# Altium footprint library My Library.PcbLib: 872 footprints (part 37 of 55)
Each footprint in its own frame and in the unit in brackets; x right, y up, seen from the top. Pads: shape width x height; smd on the part's side, far side on the other; paste and mask are expansions set on the pad; w line width, h text height; cw(c..) or ccw(c..) is an arc to the next point about the centre after c.
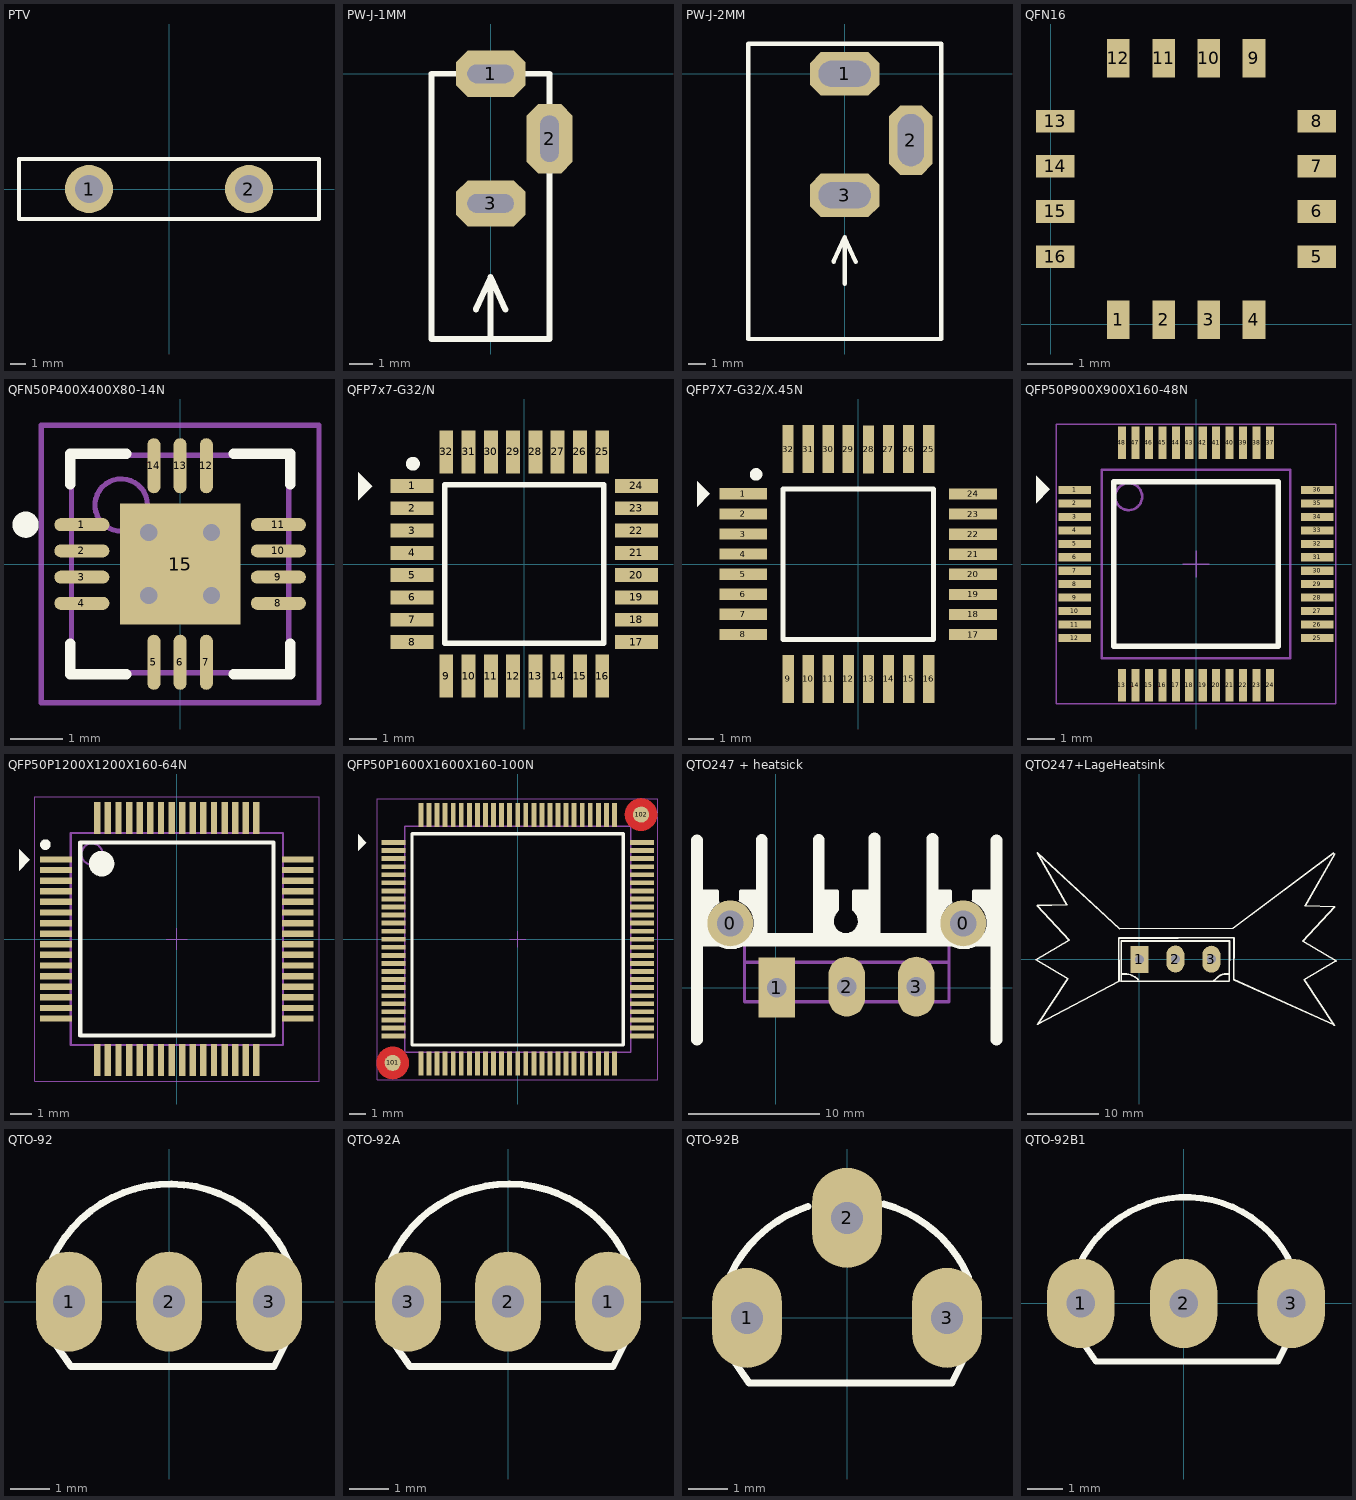
[diagram p36: the footprints below, top view; thin cyan lines are the x and y axes]

## PTV [mil] "MOV protec over votage"
height 1181.1
pads (2):
  round 120 hole 70: 1(-200,0) 2(200,0)
Top Overlay:
  lines w10: -375,-75 -375,75 375,75 375,-75 -375,-75
3D body: height 669.29, standoff -118.11, extent 172.67,-27.5 227.56,27.51
3D body: height 669.29, standoff -118.11, extent -227.33,-27.5 -172.44,27.51
3D body: height 981.15, standoff 196.85, extent -392.85,-79.74 393,77.74

## PW-J-1MM [mm] "Power Header 1mm"
pads (3):
  oct 3x2 hole 0.8 slot 2 at 0 deg paste+1: 1(0,0) 3(0,-5.588)
  oct 2x3 hole 0.8 slot 2 at 90 deg paste+1: 2(2.54,-2.794)
Top Overlay:
  lines w0.254: -0.635,-10.16 0,-8.763 ; 0,-11.43 0,-8.763 ; 0.635,-10.16 0,-8.763 ; -2.54,-11.43 2.54,-11.43 2.54,0 -2.54,0 -2.54,-11.43

## PW-J-2MM [mm] "Power Header 2mm"
pads (3):
  oct 4x2.5 hole 1.5 slot 3 at 0 deg paste+1: 1(0,0) 3(0,-6.985)
  oct 2.5x4 hole 1.5 slot 3 at 90 deg paste+1: 2(3.81,-3.81)
Top Overlay:
  lines w0.254: -0.635,-10.795 0,-9.398 ; 0,-12.065 0,-9.398 ; 0.635,-10.795 0,-9.398 ; -5.537,-15.24 -5.537,1.727 5.563,1.727 5.563,-15.24 -5.537,-15.24
3D body "User Library-PowerJack-2_5x5_7mm.step": height 11, standoff -3.5, extent -5.564,-15.2 3.836,0

## QFN16 [mm] "QFN 16 LEAD 6x6mm"
height 2
pads (16):
  rect 0.5x0.85 smd: 1(1.5,0.104) 2(2.5,0.104) 3(3.5,0.104) 4(4.5,0.104) 9(4.5,5.89) 10(3.5,5.89) 11(2.5,5.89) 12(1.5,5.89)
  rect 0.85x0.5 smd: 5(5.89,1.5) 6(5.89,2.5) 7(5.89,3.5) 8(5.89,4.5) 13(0.1,4.5) 14(0.1,3.5) 15(0.1,2.5) 16(0.1,1.5)
3D body: height 0.8, standoff 0, extent 0,0 6,6

## QFN50P400X400X80-14N [mm] "QFN, 14-Leads, Body 4,2x4,2mm (max), Pitch 0,50mm, IPC Medium Density"
height 0.8
pads (15):
  oval 1.05x0.25 smd: 1(-1.875,0.75) 2(-1.875,0.25) 3(-1.875,-0.25) 4(-1.875,-0.75) 8(1.875,-0.75) 9(1.875,-0.25) 10(1.875,0.25) 11(1.875,0.75)
  oval 0.25x1.05 smd: 5(-0.5,-1.875) 6(0,-1.875) 7(0.5,-1.875) 12(0.5,1.875) 13(0,1.875) 14(-0.5,1.875)
  rect 2.3x2.3 smd: 15(0,0)
via -0.6,0.6 diameter 0.66 hole 0.33
via 0.6,0.6 diameter 0.66 hole 0.33
via -0.6,-0.6 diameter 0.66 hole 0.33
via 0.6,-0.6 diameter 0.66 hole 0.33
Top Overlay:
  circle w0.25: c-2.95,0.75 r0.125
  lines w0.2: -2.1,-1.525 -2.1,-2.1 -1.025,-2.1 ; -2.1,1.525 -2.1,2.1 -1.025,2.1 ; 1.025,-2.1 2.1,-2.1 2.1,-1.525 ; 1.025,2.1 2.1,2.1 2.1,1.525
Mechanical 13:
  circle w0.1: c-1.125,1.125 r0.5
  lines w0.1: -2.075,-2.075 -2.075,2.075 2.075,2.075 2.075,-2.075 -2.075,-2.075
Mechanical 15:
  lines w0.1: -0.5,0 0.5,0 ; 0,-0.5 0,0.5 ; -2.65,-2.65 -2.65,2.65 2.65,2.65 2.65,-2.65 -2.65,-2.65
3D body: height 0.8, standoff 0.01, extent -2.075,-2.075 2.075,2.075

## QFP7x7-G32/N [mm] "32-Pin Plastic Thin Quad Flat Pack (TFQP)"
height 1.2
pads (32):
  rect 1.55x0.5 smd: 1(-4.025,2.8) 2(-4.025,2) 3(-4.025,1.2) 4(-4.025,0.4) 5(-4.025,-0.4) 6(-4.025,-1.2) 7(-4.025,-2) 8(-4.025,-2.8) 17(4.025,-2.8) 18(4.025,-2) 19(4.025,-1.2) 20(4.025,-0.4) 21(4.025,0.4) 22(4.025,1.2) 23(4.025,2) 24(4.025,2.8)
  rect 0.5x1.55 smd: 9(-2.8,-4.025) 10(-2,-4.025) 11(-1.2,-4.025) 12(-0.4,-4.025) 13(0.4,-4.025) 14(1.2,-4.025) 15(2,-4.025) 16(2.8,-4.025) 25(2.8,4.025) 26(2,4.025) 27(1.2,4.025) 28(0.4,4.025) 29(-0.4,4.025) 30(-1.2,4.025) 31(-2,4.025) 32(-2.8,4.025)
Top Overlay:
  circle w0.25: c-4,3.6 r0.125
  region: -5.969,3.302 -5.461,2.794 -5.969,2.286
  lines w0.2: -2.85,-2.85 2.85,-2.85 2.85,2.85 -2.85,2.85 -2.85,-2.85

## QFP7X7-G32/X.45N [mm] "QFP; 32 Leads; Body 7 x 7 mm; Pitch 0.8 mm"
height 1.6
pads (32):
  rect 1.905x0.45 smd: 1(-4.583,2.8) 2(-4.583,2) 3(-4.583,1.2) 4(-4.583,0.4) 5(-4.583,-0.4) 6(-4.583,-1.2) 7(-4.583,-2) 8(-4.583,-2.8) 17(4.572,-2.806) 18(4.572,-2.006) 19(4.572,-1.206) 20(4.572,-0.406) 21(4.572,0.394) 22(4.572,1.194) 23(4.572,1.994) 24(4.572,2.794)
  rect 0.45x1.905 smd: 9(-2.794,-4.572) 10(-1.994,-4.572) 11(-1.194,-4.572) 12(-0.394,-4.572) 13(0.406,-4.572) 14(1.206,-4.572) 15(2.006,-4.572) 16(2.806,-4.572) 25(2.8,4.583) 26(2,4.583) 27(1.2,4.583) 28(0.406,4.572) 29(-0.4,4.583) 30(-1.2,4.583) 31(-2,4.583) 32(-2.8,4.583)
Top Overlay:
  circle w0.25: c-4.075,3.575 r0.125
  region: -6.426,3.302 -5.918,2.794 -6.426,2.286
  lines w0.2: -3,-3 -3,3 3,3 3,-3 -3,-3
3D body "Atmega8.step": height 1.13, standoff 0.02, extent -4.743,-4.857 4.857,4.743

## QFP50P900X900X160-48N [mm] "QFP,0.50mm pitch,square;12 pin X 12 pin,7.00mm X 7.00mm X 1.60mm H body"
height 1.6
pads (48):
  rect 1.2x0.3 smd: 1(-4.5,2.75) 2(-4.5,2.25) 3(-4.5,1.75) 4(-4.5,1.25) 5(-4.5,0.75) 6(-4.5,0.25) 7(-4.5,-0.25) 8(-4.5,-0.75) 9(-4.5,-1.25) 10(-4.5,-1.75) 11(-4.5,-2.25) 12(-4.5,-2.75) 25(4.5,-2.75) 26(4.5,-2.25) 27(4.5,-1.75) 28(4.5,-1.25) 29(4.5,-0.75) 30(4.5,-0.25) 31(4.5,0.25) 32(4.5,0.75) 33(4.5,1.25) 34(4.5,1.75) 35(4.5,2.25) 36(4.5,2.75)
  rect 0.3x1.2 smd: 13(-2.75,-4.5) 14(-2.25,-4.5) 15(-1.75,-4.5) 16(-1.25,-4.5) 17(-0.75,-4.5) 18(-0.25,-4.5) 19(0.25,-4.5) 20(0.75,-4.5) 21(1.25,-4.5) 22(1.75,-4.5) 23(2.25,-4.5) 24(2.75,-4.5) 37(2.75,4.5) 38(2.25,4.5) 39(1.75,4.5) 40(1.25,4.5) 41(0.75,4.5) 42(0.25,4.5) 43(-0.25,4.5) 44(-0.75,4.5) 45(-1.25,4.5) 46(-1.75,4.5) 47(-2.25,4.5) 48(-2.75,4.5)
Top Overlay:
  region: -5.944,3.277 -5.436,2.769 -5.944,2.261
  lines w0.2: -3.05,-3.05 3.05,-3.05 3.05,3.05 -3.05,3.05 -3.05,-3.05
Mechanical 12:
  lines w0.001: -3.5,-3.5 3.5,-3.5 3.5,3.5 -3.5,3.5 -3.5,-3.5
Mechanical 13:
  circle w0.1: c-2.5,2.5 r0.5
  lines w0.1: -3.5,-3.5 3.5,-3.5 3.5,3.5 -3.5,3.5 -3.5,-3.5
Mechanical 15:
  lines w0.05: -0.5,0 0.5,0 ; 0,-0.5 0,0.5 ; -5.2,-5.2 5.2,-5.2 5.2,5.2 -5.2,5.2 -5.2,-5.2
3D body "SW3dPS-P-LQFP48-7x7-0.50.STEP": height 1.42, standoff -0.03, extent -4.496,-4.496 4.504,4.504

## QFP50P1200X1200X160-64N [mm] "QFP,0.50mm pitch,square;16 pin X 16 pin,10.00mm X 10.00mm X 1.60mm H body"
height 1.6
pads (64):
  rect 1.5x0.3 smd: 1(-5.7,3.75) 2(-5.7,3.25) 3(-5.7,2.75) 4(-5.7,2.25) 5(-5.7,1.75) 6(-5.7,1.25) 7(-5.7,0.75) 8(-5.7,0.25) 9(-5.7,-0.25) 10(-5.7,-0.75) 11(-5.7,-1.25) 12(-5.7,-1.75) 13(-5.7,-2.25) 14(-5.7,-2.75) 15(-5.7,-3.25) 16(-5.7,-3.75) 33(5.7,-3.75) 34(5.7,-3.25) 35(5.7,-2.75) 36(5.7,-2.25) 37(5.7,-1.75) 38(5.7,-1.25) 39(5.7,-0.75) 40(5.7,-0.25) 41(5.7,0.25) 42(5.7,0.75) 43(5.7,1.25) 44(5.7,1.75) 45(5.7,2.25) 46(5.7,2.75) 47(5.7,3.25) 48(5.7,3.75)
  rect 0.3x1.5 smd: 17(-3.75,-5.7) 18(-3.25,-5.7) 19(-2.75,-5.7) 20(-2.25,-5.7) 21(-1.75,-5.7) 22(-1.25,-5.7) 23(-0.75,-5.7) 24(-0.25,-5.7) 25(0.25,-5.7) 26(0.75,-5.7) 27(1.25,-5.7) 28(1.75,-5.7) 29(2.25,-5.7) 30(2.75,-5.7) 31(3.25,-5.7) 32(3.75,-5.7) 49(3.75,5.7) 50(3.25,5.7) 51(2.75,5.7) 52(2.25,5.7) 53(1.75,5.7) 54(1.25,5.7) 55(0.75,5.7) 56(0.25,5.7) 57(-0.25,5.7) 58(-0.75,5.7) 59(-1.25,5.7) 60(-1.75,5.7) 61(-2.25,5.7) 62(-2.75,5.7) 63(-3.25,5.7) 64(-3.75,5.7)
Top Overlay:
  circle w0.25: c-6.2,4.45 r0.125
  circle w0.6: c-3.55,3.55 r0.3
  region: -7.442,4.242 -6.934,3.734 -7.442,3.226
  lines w0.2: -4.55,-4.55 -4.55,4.55 4.55,4.55 4.55,-4.55 -4.55,-4.55
Mechanical 12:
  lines w0.001: -5,-5 -5,5 5,5 5,-5 -5,-5
Mechanical 13:
  circle w0.1: c-4,4 r0.5
  lines w0.1: -5,-5 -5,5 5,5 5,-5 -5,-5
Mechanical 15:
  lines w0.05: -0.5,0 0.5,0 ; 0,-0.5 0,0.5 ; -6.7,-6.7 -6.7,6.7 6.7,6.7 6.7,-6.7 -6.7,-6.7

## QFP50P1600X1600X160-100N [mm] "QFP,0.50mm pitch,square;25 pin X 25 pin,14.00mm X 14.00mm X 1.60mm H body"
height 1.6
pads (102):
  rect 1.5x0.3 smd: 1(-7.7,6) 2(-7.7,5.5) 3(-7.7,5) 4(-7.7,4.5) 5(-7.7,4) 6(-7.7,3.5) 7(-7.7,3) 8(-7.7,2.5) 9(-7.7,2) 10(-7.7,1.5) 11(-7.7,1) 12(-7.7,0.5) 13(-7.7,0) 14(-7.7,-0.5) 15(-7.7,-1) 16(-7.7,-1.5) 17(-7.7,-2) 18(-7.7,-2.5) 19(-7.7,-3) 20(-7.7,-3.5) 21(-7.7,-4) 22(-7.7,-4.5) 23(-7.7,-5) 24(-7.7,-5.5) 25(-7.7,-6) 51(7.7,-6) 52(7.7,-5.5) 53(7.7,-5) 54(7.7,-4.5) 55(7.7,-4) 56(7.7,-3.5) 57(7.7,-3) 58(7.7,-2.5) 59(7.7,-2) 60(7.7,-1.5) 61(7.7,-1) 62(7.7,-0.5) 63(7.7,0) 64(7.7,0.5) 65(7.7,1) 66(7.7,1.5) 67(7.7,2) 68(7.7,2.5) 69(7.7,3) 70(7.7,3.5) 71(7.7,4) 72(7.7,4.5) 73(7.7,5) 74(7.7,5.5) 75(7.7,6)
  rect 0.3x1.5 smd: 26(-6,-7.7) 27(-5.5,-7.7) 28(-5,-7.7) 29(-4.5,-7.7) 30(-4,-7.7) 31(-3.5,-7.7) 32(-3,-7.7) 33(-2.5,-7.7) 34(-2,-7.7) 35(-1.5,-7.7) 36(-1,-7.7) 37(-0.5,-7.7) 38(0,-7.7) 39(0.5,-7.7) 40(1,-7.7) 41(1.5,-7.7) 42(2,-7.7) 43(2.5,-7.7) 44(3,-7.7) 45(3.5,-7.7) 46(4,-7.7) 47(4.5,-7.7) 48(5,-7.7) 49(5.5,-7.7) 50(6,-7.7) 76(6,7.7) 77(5.5,7.7) 78(5,7.7) 79(4.5,7.7) 80(4,7.7) 81(3.5,7.7) 82(3,7.7) 83(2.5,7.7) 84(2,7.7) 85(1.5,7.7) 86(1,7.7) 87(0.5,7.7) 88(0,7.7) 89(-0.5,7.7) 90(-1,7.7) 91(-1.5,7.7) 92(-2,7.7) 93(-2.5,7.7) 94(-3,7.7) 95(-3.5,7.7) 96(-4,7.7) 97(-4.5,7.7) 98(-5,7.7) 99(-5.5,7.7) 100(-6,7.7)
  round 1 smd: 101(-7.753,-7.669) 102(7.647,7.731)
Top Layer:
  pour cut-out: 153 vertices and 0 holes, not listed, extent -8.753,-8.669 -6.753,-6.669
  pour cut-out: 153 vertices and 0 holes, not listed, extent 6.647,6.731 8.647,8.731
Top Overlay:
  region: -9.906,6.508 -9.398,6 -9.906,5.492
  lines w0.2: -6.55,-6.55 -6.55,6.55 6.55,6.55 6.55,-6.55 -6.55,-6.55
Mechanical 12:
  lines w0.001: -7,-7 -7,7 7,7 7,-7 -7,-7
Mechanical 13:
  lines w0.1: -7,-7 -7,7 ; -7,-7 7,-7 ; -7,-7 -7,7 ; -7,-7 7,-7 ; -7,7 7,7 ; -7,7 7,7 ; 7,-7 7,7 ; 7,-7 7,7
Mechanical 15:
  lines w0.05: -0.5,0 0.5,0 ; 0,-0.5 0,0.5 ; -8.7,-8.7 -8.7,8.7 8.7,8.7 8.7,-8.7 -8.7,-8.7
3D body: height 1.6, standoff 0.05, extent -7,-7 7,7
3D body: height 0.85, standoff 0.75, extent -7.264,5.85 -6.807,6.147
3D body: height 0.85, standoff 0, extent -7.351,5.85 -7.264,6.147
3D body: height 0.1, standoff 0, extent -8.085,5.85 -7.351,6.147
3D body: height 0.1, standoff 0, extent -8.085,5.35 -7.351,5.647
3D body: height 0.85, standoff 0, extent -7.351,5.35 -7.264,5.647
3D body: height 0.85, standoff 0.75, extent -7.264,5.35 -6.807,5.647
3D body: height 0.1, standoff 0, extent -8.085,4.85 -7.351,5.147
3D body: height 0.85, standoff 0, extent -7.351,4.85 -7.264,5.147
3D body: height 0.85, standoff 0.75, extent -7.264,4.85 -6.807,5.147
3D body: height 0.85, standoff 0.75, extent -7.264,3.35 -6.807,3.647
3D body: height 0.85, standoff 0, extent -7.351,3.35 -7.264,3.647
3D body: height 0.1, standoff 0, extent -8.085,3.35 -7.351,3.647
3D body: height 0.85, standoff 0.75, extent -7.264,3.85 -6.807,4.147
3D body: height 0.85, standoff 0, extent -7.351,3.85 -7.264,4.147
3D body: height 0.1, standoff 0, extent -8.085,3.85 -7.351,4.147
3D body: height 0.1, standoff 0, extent -8.085,4.35 -7.351,4.647
3D body: height 0.85, standoff 0, extent -7.351,4.35 -7.264,4.647
3D body: height 0.85, standoff 0.75, extent -7.264,4.35 -6.807,4.647
3D body: height 0.85, standoff 0.75, extent -7.264,1.85 -6.807,2.147
3D body: height 0.85, standoff 0, extent -7.351,1.85 -7.264,2.147
3D body: height 0.1, standoff 0, extent -8.085,1.85 -7.351,2.147
3D body: height 0.1, standoff 0, extent -8.085,1.35 -7.351,1.647
3D body: height 0.85, standoff 0, extent -7.351,1.35 -7.264,1.647
3D body: height 0.85, standoff 0.75, extent -7.264,1.35 -6.807,1.647
3D body: height 0.85, standoff 0.75, extent -7.264,2.35 -6.807,2.647
3D body: height 0.85, standoff 0, extent -7.351,2.35 -7.264,2.647
3D body: height 0.1, standoff 0, extent -8.085,2.35 -7.351,2.647
3D body: height 0.85, standoff 0.75, extent -7.264,2.85 -6.807,3.147
3D body: height 0.85, standoff 0, extent -7.351,2.85 -7.264,3.147
3D body: height 0.1, standoff 0, extent -8.085,2.85 -7.351,3.147
3D body: height 0.1, standoff 0, extent -8.085,3.35 -7.351,3.647
3D body: height 0.85, standoff 0, extent -7.351,3.35 -7.264,3.647
3D body: height 0.85, standoff 0.75, extent -7.264,3.35 -6.807,3.647
3D body: height 0.85, standoff 0.75, extent -7.264,-0.65 -6.807,-0.353
3D body: height 0.85, standoff 0, extent -7.351,-0.65 -7.264,-0.353
3D body: height 0.1, standoff 0, extent -8.085,-0.65 -7.351,-0.353
3D body: height 0.1, standoff 0, extent -8.085,-1.15 -7.351,-0.853
3D body: height 0.85, standoff 0, extent -7.351,-1.15 -7.264,-0.853
3D body: height 0.85, standoff 0.75, extent -7.264,-1.15 -6.807,-0.853
3D body: height 0.85, standoff 0.75, extent -7.264,-0.15 -6.807,0.147
3D body: height 0.85, standoff 0, extent -7.351,-0.15 -7.264,0.147
3D body: height 0.1, standoff 0, extent -8.085,-0.15 -7.351,0.147
3D body: height 0.85, standoff 0.75, extent -7.264,0.35 -6.807,0.647
3D body: height 0.85, standoff 0, extent -7.351,0.35 -7.264,0.647
3D body: height 0.1, standoff 0, extent -8.085,0.35 -7.351,0.647
3D body: height 0.1, standoff 0, extent -8.085,0.85 -7.351,1.147
3D body: height 0.85, standoff 0, extent -7.351,0.85 -7.264,1.147
3D body: height 0.85, standoff 0.75, extent -7.264,0.85 -6.807,1.147
3D body: height 0.85, standoff 0.75, extent -7.264,-3.15 -6.807,-2.853
3D body: height 0.85, standoff 0, extent -7.351,-3.15 -7.264,-2.853
3D body: height 0.1, standoff 0, extent -8.085,-3.15 -7.351,-2.853
3D body: height 0.1, standoff 0, extent -8.085,-3.65 -7.351,-3.353
3D body: height 0.85, standoff 0, extent -7.351,-3.65 -7.264,-3.353
3D body: height 0.85, standoff 0.75, extent -7.264,-3.65 -6.807,-3.353
3D body: height 0.85, standoff 0.75, extent -7.264,-2.65 -6.807,-2.353
3D body: height 0.85, standoff 0, extent -7.351,-2.65 -7.264,-2.353
3D body: height 0.1, standoff 0, extent -8.085,-2.65 -7.351,-2.353
3D body: height 0.85, standoff 0.75, extent -7.264,-2.15 -6.807,-1.853
3D body: height 0.85, standoff 0, extent -7.351,-2.15 -7.264,-1.853
3D body: height 0.1, standoff 0, extent -8.085,-2.15 -7.351,-1.853
3D body: height 0.1, standoff 0, extent -8.085,-1.65 -7.351,-1.353
3D body: height 0.85, standoff 0, extent -7.351,-1.65 -7.264,-1.353
3D body: height 0.85, standoff 0.75, extent -7.264,-1.65 -6.807,-1.353
3D body: height 0.85, standoff 0.75, extent -7.264,-5.65 -6.807,-5.353
3D body: height 0.85, standoff 0, extent -7.351,-5.65 -7.264,-5.353
3D body: height 0.1, standoff 0, extent -8.085,-5.65 -7.351,-5.353
3D body: height 0.1, standoff 0, extent -8.085,-6.15 -7.351,-5.853
3D body: height 0.85, standoff 0, extent -7.351,-6.15 -7.264,-5.853
3D body: height 0.85, standoff 0.75, extent -7.264,-6.15 -6.807,-5.853
3D body: height 0.85, standoff 0.75, extent -7.264,-5.15 -6.807,-4.853
3D body: height 0.85, standoff 0, extent -7.351,-5.15 -7.264,-4.853
3D body: height 0.1, standoff 0, extent -8.085,-5.15 -7.351,-4.853
3D body: height 0.85, standoff 0.75, extent -7.264,-4.65 -6.807,-4.353
3D body: height 0.85, standoff 0, extent -7.351,-4.65 -7.264,-4.353
3D body: height 0.1, standoff 0, extent -8.085,-4.65 -7.351,-4.353
3D body: height 0.1, standoff 0, extent -8.085,-4.15 -7.351,-3.853
3D body: height 0.85, standoff 0, extent -7.351,-4.15 -7.264,-3.853
3D body: height 0.85, standoff 0.75, extent -7.264,-4.15 -6.807,-3.853
3D body: height 0.85, standoff 0.75, extent 3.853,-7.264 4.15,-6.807
3D body: height 0.85, standoff 0, extent 3.853,-7.351 4.15,-7.264
3D body: height 0.1, standoff 0, extent 3.853,-8.085 4.15,-7.351
3D body: height 0.1, standoff 0, extent 4.353,-8.085 4.65,-7.351
3D body: height 0.85, standoff 0, extent 4.353,-7.351 4.65,-7.264
3D body: height 0.85, standoff 0.75, extent 4.353,-7.264 4.65,-6.807
3D body: height 0.1, standoff 0, extent 4.853,-8.085 5.15,-7.351
3D body: height 0.85, standoff 0, extent 4.853,-7.351 5.15,-7.264
3D body: height 0.85, standoff 0.75, extent 4.853,-7.264 5.15,-6.807
3D body: height 0.85, standoff 0.75, extent 5.853,-7.264 6.15,-6.807
3D body: height 0.85, standoff 0, extent 5.853,-7.351 6.15,-7.264
3D body: height 0.1, standoff 0, extent 5.853,-8.085 6.15,-7.351
3D body: height 0.1, standoff 0, extent 5.353,-8.085 5.65,-7.351
3D body: height 0.85, standoff 0, extent 5.353,-7.351 5.65,-7.264
3D body: height 0.85, standoff 0.75, extent 5.353,-7.264 5.65,-6.807
3D body: height 0.85, standoff 0.75, extent 1.353,-7.264 1.65,-6.807
3D body: height 0.85, standoff 0, extent 1.353,-7.351 1.65,-7.264
3D body: height 0.1, standoff 0, extent 1.353,-8.085 1.65,-7.351
3D body: height 0.1, standoff 0, extent 1.853,-8.085 2.15,-7.351
3D body: height 0.85, standoff 0, extent 1.853,-7.351 2.15,-7.264
3D body: height 0.85, standoff 0.75, extent 1.853,-7.264 2.15,-6.807
3D body: height 0.1, standoff 0, extent 2.353,-8.085 2.65,-7.351
3D body: height 0.85, standoff 0, extent 2.353,-7.351 2.65,-7.264
3D body: height 0.85, standoff 0.75, extent 2.353,-7.264 2.65,-6.807
3D body: height 0.85, standoff 0.75, extent 3.353,-7.264 3.65,-6.807
3D body: height 0.85, standoff 0, extent 3.353,-7.351 3.65,-7.264
3D body: height 0.1, standoff 0, extent 3.353,-8.085 3.65,-7.351
3D body: height 0.1, standoff 0, extent 2.853,-8.085 3.15,-7.351
3D body: height 0.85, standoff 0, extent 2.853,-7.351 3.15,-7.264
3D body: height 0.85, standoff 0.75, extent 2.853,-7.264 3.15,-6.807
3D body: height 0.85, standoff 0.75, extent -1.147,-7.264 -0.85,-6.807
3D body: height 0.85, standoff 0, extent -1.147,-7.351 -0.85,-7.264
3D body: height 0.1, standoff 0, extent -1.147,-8.085 -0.85,-7.351
3D body: height 0.1, standoff 0, extent -0.647,-8.085 -0.35,-7.351
3D body: height 0.85, standoff 0, extent -0.647,-7.351 -0.35,-7.264
3D body: height 0.85, standoff 0.75, extent -0.647,-7.264 -0.35,-6.807
3D body: height 0.1, standoff 0, extent -0.147,-8.085 0.15,-7.351
3D body: height 0.85, standoff 0, extent -0.147,-7.351 0.15,-7.264
3D body: height 0.85, standoff 0.75, extent -0.147,-7.264 0.15,-6.807
3D body: height 0.85, standoff 0.75, extent 0.853,-7.264 1.15,-6.807
3D body: height 0.85, standoff 0, extent 0.853,-7.351 1.15,-7.264
3D body: height 0.1, standoff 0, extent 0.853,-8.085 1.15,-7.351
3D body: height 0.1, standoff 0, extent 0.353,-8.085 0.65,-7.351
3D body: height 0.85, standoff 0, extent 0.353,-7.351 0.65,-7.264
3D body: height 0.85, standoff 0.75, extent 0.353,-7.264 0.65,-6.807
3D body: height 0.85, standoff 0.75, extent -3.647,-7.264 -3.35,-6.807
3D body: height 0.85, standoff 0, extent -3.647,-7.351 -3.35,-7.264
3D body: height 0.1, standoff 0, extent -3.647,-8.085 -3.35,-7.351
3D body: height 0.1, standoff 0, extent -3.147,-8.085 -2.85,-7.351
3D body: height 0.85, standoff 0, extent -3.147,-7.351 -2.85,-7.264
3D body: height 0.85, standoff 0.75, extent -3.147,-7.264 -2.85,-6.807
3D body: height 0.1, standoff 0, extent -2.647,-8.085 -2.35,-7.351
3D body: height 0.85, standoff 0, extent -2.647,-7.351 -2.35,-7.264
3D body: height 0.85, standoff 0.75, extent -2.647,-7.264 -2.35,-6.807
3D body: height 0.85, standoff 0.75, extent -1.647,-7.264 -1.35,-6.807
3D body: height 0.85, standoff 0, extent -1.647,-7.351 -1.35,-7.264
3D body: height 0.1, standoff 0, extent -1.647,-8.085 -1.35,-7.351
3D body: height 0.1, standoff 0, extent -2.147,-8.085 -1.85,-7.351
3D body: height 0.85, standoff 0, extent -2.147,-7.351 -1.85,-7.264
3D body: height 0.85, standoff 0.75, extent -2.147,-7.264 -1.85,-6.807
3D body: height 0.85, standoff 0.75, extent -4.647,-7.264 -4.35,-6.807
3D body: height 0.85, standoff 0, extent -4.647,-7.351 -4.35,-7.264
3D body: height 0.1, standoff 0, extent -4.647,-8.085 -4.35,-7.351
3D body: height 0.1, standoff 0, extent -4.147,-8.085 -3.85,-7.351
3D body: height 0.85, standoff 0, extent -4.147,-7.351 -3.85,-7.264
3D body: height 0.85, standoff 0.75, extent -4.147,-7.264 -3.85,-6.807
3D body: height 0.1, standoff 0, extent -3.647,-8.085 -3.35,-7.351
3D body: height 0.85, standoff 0, extent -3.647,-7.351 -3.35,-7.264
3D body: height 0.85, standoff 0.75, extent -3.647,-7.264 -3.35,-6.807
3D body: height 0.85, standoff 0.75, extent -5.147,-7.264 -4.85,-6.807
3D body: height 0.85, standoff 0, extent -5.147,-7.351 -4.85,-7.264
3D body: height 0.1, standoff 0, extent -5.147,-8.085 -4.85,-7.351
3D body: height 0.85, standoff 0.75, extent -5.647,-7.264 -5.35,-6.807
3D body: height 0.85, standoff 0, extent -5.647,-7.351 -5.35,-7.264
3D body: height 0.1, standoff 0, extent -5.647,-8.085 -5.35,-7.351
3D body: height 0.1, standoff 0, extent -6.147,-8.085 -5.85,-7.351
3D body: height 0.85, standoff 0, extent -6.147,-7.351 -5.85,-7.264
3D body: height 0.85, standoff 0.75, extent -6.147,-7.264 -5.85,-6.807
3D body: height 0.85, standoff 0.75, extent 6.807,3.853 7.264,4.15
3D body: height 0.85, standoff 0, extent 7.264,3.853 7.351,4.15
3D body: height 0.1, standoff 0, extent 7.351,3.853 8.085,4.15
3D body: height 0.1, standoff 0, extent 7.351,4.353 8.085,4.65
3D body: height 0.85, standoff 0, extent 7.264,4.353 7.351,4.65
3D body: height 0.85, standoff 0.75, extent 6.807,4.353 7.264,4.65
3D body: height 0.1, standoff 0, extent 7.351,4.853 8.085,5.15
3D body: height 0.85, standoff 0, extent 7.264,4.853 7.351,5.15
3D body: height 0.85, standoff 0.75, extent 6.807,4.853 7.264,5.15
3D body: height 0.85, standoff 0.75, extent 6.807,5.853 7.264,6.15
3D body: height 0.85, standoff 0, extent 7.264,5.853 7.351,6.15
3D body: height 0.1, standoff 0, extent 7.351,5.853 8.085,6.15
3D body: height 0.1, standoff 0, extent 7.351,5.353 8.085,5.65
3D body: height 0.85, standoff 0, extent 7.264,5.353 7.351,5.65
3D body: height 0.85, standoff 0.75, extent 6.807,5.353 7.264,5.65
3D body: height 0.85, standoff 0.75, extent 6.807,1.353 7.264,1.65
3D body: height 0.85, standoff 0, extent 7.264,1.353 7.351,1.65
3D body: height 0.1, standoff 0, extent 7.351,1.353 8.085,1.65
3D body: height 0.1, standoff 0, extent 7.351,1.853 8.085,2.15
3D body: height 0.85, standoff 0, extent 7.264,1.853 7.351,2.15
3D body: height 0.85, standoff 0.75, extent 6.807,1.853 7.264,2.15
3D body: height 0.1, standoff 0, extent 7.351,2.353 8.085,2.65
3D body: height 0.85, standoff 0, extent 7.264,2.353 7.351,2.65
3D body: height 0.85, standoff 0.75, extent 6.807,2.353 7.264,2.65
3D body: height 0.85, standoff 0.75, extent 6.807,3.353 7.264,3.65
3D body: height 0.85, standoff 0, extent 7.264,3.353 7.351,3.65
3D body: height 0.1, standoff 0, extent 7.351,3.353 8.085,3.65
3D body: height 0.1, standoff 0, extent 7.351,2.853 8.085,3.15
3D body: height 0.85, standoff 0, extent 7.264,2.853 7.351,3.15
3D body: height 0.85, standoff 0.75, extent 6.807,2.853 7.264,3.15
3D body: height 0.85, standoff 0.75, extent 6.807,-1.147 7.264,-0.85
3D body: height 0.85, standoff 0, extent 7.264,-1.147 7.351,-0.85
3D body: height 0.1, standoff 0, extent 7.351,-1.147 8.085,-0.85
3D body: height 0.1, standoff 0, extent 7.351,-0.647 8.085,-0.35
3D body: height 0.85, standoff 0, extent 7.264,-0.647 7.351,-0.35
3D body: height 0.85, standoff 0.75, extent 6.807,-0.647 7.264,-0.35
3D body: height 0.1, standoff 0, extent 7.351,-0.147 8.085,0.15
3D body: height 0.85, standoff 0, extent 7.264,-0.147 7.351,0.15
3D body: height 0.85, standoff 0.75, extent 6.807,-0.147 7.264,0.15
3D body: height 0.85, standoff 0.75, extent 6.807,0.853 7.264,1.15
3D body: height 0.85, standoff 0, extent 7.264,0.853 7.351,1.15
3D body: height 0.1, standoff 0, extent 7.351,0.853 8.085,1.15
3D body: height 0.1, standoff 0, extent 7.351,0.353 8.085,0.65
3D body: height 0.85, standoff 0, extent 7.264,0.353 7.351,0.65
3D body: height 0.85, standoff 0.75, extent 6.807,0.353 7.264,0.65
3D body: height 0.85, standoff 0.75, extent 6.807,-3.647 7.264,-3.35
3D body: height 0.85, standoff 0, extent 7.264,-3.647 7.351,-3.35
3D body: height 0.1, standoff 0, extent 7.351,-3.647 8.085,-3.35
3D body: height 0.1, standoff 0, extent 7.351,-3.147 8.085,-2.85
3D body: height 0.85, standoff 0, extent 7.264,-3.147 7.351,-2.85
3D body: height 0.85, standoff 0.75, extent 6.807,-3.147 7.264,-2.85
3D body: height 0.1, standoff 0, extent 7.351,-2.647 8.085,-2.35
3D body: height 0.85, standoff 0, extent 7.264,-2.647 7.351,-2.35
3D body: height 0.85, standoff 0.75, extent 6.807,-2.647 7.264,-2.35
3D body: height 0.85, standoff 0.75, extent 6.807,-1.647 7.264,-1.35
3D body: height 0.85, standoff 0, extent 7.264,-1.647 7.351,-1.35
3D body: height 0.1, standoff 0, extent 7.351,-1.647 8.085,-1.35
3D body: height 0.1, standoff 0, extent 7.351,-2.147 8.085,-1.85
3D body: height 0.85, standoff 0, extent 7.264,-2.147 7.351,-1.85
3D body: height 0.85, standoff 0.75, extent 6.807,-2.147 7.264,-1.85
3D body: height 0.85, standoff 0.75, extent 6.807,-4.647 7.264,-4.35
3D body: height 0.85, standoff 0, extent 7.264,-4.647 7.351,-4.35
3D body: height 0.1, standoff 0, extent 7.351,-4.647 8.085,-4.35
3D body: height 0.1, standoff 0, extent 7.351,-4.147 8.085,-3.85
3D body: height 0.85, standoff 0, extent 7.264,-4.147 7.351,-3.85
3D body: height 0.85, standoff 0.75, extent 6.807,-4.147 7.264,-3.85
3D body: height 0.1, standoff 0, extent 7.351,-3.647 8.085,-3.35
3D body: height 0.85, standoff 0, extent 7.264,-3.647 7.351,-3.35
3D body: height 0.85, standoff 0.75, extent 6.807,-3.647 7.264,-3.35
3D body: height 0.85, standoff 0.75, extent 6.807,-5.147 7.264,-4.85
3D body: height 0.85, standoff 0, extent 7.264,-5.147 7.351,-4.85
3D body: height 0.1, standoff 0, extent 7.351,-5.147 8.085,-4.85
3D body: height 0.85, standoff 0.75, extent 6.807,-5.647 7.264,-5.35
3D body: height 0.85, standoff 0, extent 7.264,-5.647 7.351,-5.35
3D body: height 0.1, standoff 0, extent 7.351,-5.647 8.085,-5.35
3D body: height 0.1, standoff 0, extent 7.351,-6.147 8.085,-5.85
3D body: height 0.85, standoff 0, extent 7.264,-6.147 7.351,-5.85
3D body: height 0.85, standoff 0.75, extent 6.807,-6.147 7.264,-5.85
3D body: height 0.85, standoff 0.75, extent -4.15,6.807 -3.853,7.264
3D body: height 0.85, standoff 0, extent -4.15,7.264 -3.853,7.351
3D body: height 0.1, standoff 0, extent -4.15,7.351 -3.853,8.085
3D body: height 0.1, standoff 0, extent -4.65,7.351 -4.353,8.085
3D body: height 0.85, standoff 0, extent -4.65,7.264 -4.353,7.351
3D body: height 0.85, standoff 0.75, extent -4.65,6.807 -4.353,7.264
3D body: height 0.1, standoff 0, extent -5.15,7.351 -4.853,8.085
3D body: height 0.85, standoff 0, extent -5.15,7.264 -4.853,7.351
3D body: height 0.85, standoff 0.75, extent -5.15,6.807 -4.853,7.264
3D body: height 0.85, standoff 0.75, extent -6.15,6.807 -5.853,7.264
3D body: height 0.85, standoff 0, extent -6.15,7.264 -5.853,7.351
3D body: height 0.1, standoff 0, extent -6.15,7.351 -5.853,8.085
3D body: height 0.1, standoff 0, extent -5.65,7.351 -5.353,8.085
3D body: height 0.85, standoff 0, extent -5.65,7.264 -5.353,7.351
3D body: height 0.85, standoff 0.75, extent -5.65,6.807 -5.353,7.264
3D body: height 0.85, standoff 0.75, extent -1.65,6.807 -1.353,7.264
3D body: height 0.85, standoff 0, extent -1.65,7.264 -1.353,7.351
3D body: height 0.1, standoff 0, extent -1.65,7.351 -1.353,8.085
3D body: height 0.1, standoff 0, extent -2.15,7.351 -1.853,8.085
3D body: height 0.85, standoff 0, extent -2.15,7.264 -1.853,7.351
3D body: height 0.85, standoff 0.75, extent -2.15,6.807 -1.853,7.264
3D body: height 0.1, standoff 0, extent -2.65,7.351 -2.353,8.085
3D body: height 0.85, standoff 0, extent -2.65,7.264 -2.353,7.351
3D body: height 0.85, standoff 0.75, extent -2.65,6.807 -2.353,7.264
3D body: height 0.85, standoff 0.75, extent -3.65,6.807 -3.353,7.264
3D body: height 0.85, standoff 0, extent -3.65,7.264 -3.353,7.351
3D body: height 0.1, standoff 0, extent -3.65,7.351 -3.353,8.085
3D body: height 0.1, standoff 0, extent -3.15,7.351 -2.853,8.085
3D body: height 0.85, standoff 0, extent -3.15,7.264 -2.853,7.351
3D body: height 0.85, standoff 0.75, extent -3.15,6.807 -2.853,7.264
3D body: height 0.85, standoff 0.75, extent 0.85,6.807 1.147,7.264
3D body: height 0.85, standoff 0, extent 0.85,7.264 1.147,7.351
3D body: height 0.1, standoff 0, extent 0.85,7.351 1.147,8.085
3D body: height 0.1, standoff 0, extent 0.35,7.351 0.647,8.085
3D body: height 0.85, standoff 0, extent 0.35,7.264 0.647,7.351
3D body: height 0.85, standoff 0.75, extent 0.35,6.807 0.647,7.264
3D body: height 0.1, standoff 0, extent -0.15,7.351 0.147,8.085
3D body: height 0.85, standoff 0, extent -0.15,7.264 0.147,7.351
3D body: height 0.85, standoff 0.75, extent -0.15,6.807 0.147,7.264
3D body: height 0.85, standoff 0.75, extent -1.15,6.807 -0.853,7.264
3D body: height 0.85, standoff 0, extent -1.15,7.264 -0.853,7.351
3D body: height 0.1, standoff 0, extent -1.15,7.351 -0.853,8.085
3D body: height 0.1, standoff 0, extent -0.65,7.351 -0.353,8.085
3D body: height 0.85, standoff 0, extent -0.65,7.264 -0.353,7.351
3D body: height 0.85, standoff 0.75, extent -0.65,6.807 -0.353,7.264
3D body: height 0.85, standoff 0.75, extent 3.35,6.807 3.647,7.264
3D body: height 0.85, standoff 0, extent 3.35,7.264 3.647,7.351
3D body: height 0.1, standoff 0, extent 3.35,7.351 3.647,8.085
3D body: height 0.1, standoff 0, extent 2.85,7.351 3.147,8.085
3D body: height 0.85, standoff 0, extent 2.85,7.264 3.147,7.351
3D body: height 0.85, standoff 0.75, extent 2.85,6.807 3.147,7.264
3D body: height 0.1, standoff 0, extent 2.35,7.351 2.647,8.085
3D body: height 0.85, standoff 0, extent 2.35,7.264 2.647,7.351
3D body: height 0.85, standoff 0.75, extent 2.35,6.807 2.647,7.264
3D body: height 0.85, standoff 0.75, extent 1.35,6.807 1.647,7.264
3D body: height 0.85, standoff 0, extent 1.35,7.264 1.647,7.351
3D body: height 0.1, standoff 0, extent 1.35,7.351 1.647,8.085
3D body: height 0.1, standoff 0, extent 1.85,7.351 2.147,8.085
3D body: height 0.85, standoff 0, extent 1.85,7.264 2.147,7.351
3D body: height 0.85, standoff 0.75, extent 1.85,6.807 2.147,7.264
3D body: height 0.85, standoff 0.75, extent 4.35,6.807 4.647,7.264
3D body: height 0.85, standoff 0, extent 4.35,7.264 4.647,7.351
3D body: height 0.1, standoff 0, extent 4.35,7.351 4.647,8.085
3D body: height 0.1, standoff 0, extent 3.85,7.351 4.147,8.085
3D body: height 0.85, standoff 0, extent 3.85,7.264 4.147,7.351
3D body: height 0.85, standoff 0.75, extent 3.85,6.807 4.147,7.264
3D body: height 0.1, standoff 0, extent 3.35,7.351 3.647,8.085
3D body: height 0.85, standoff 0, extent 3.35,7.264 3.647,7.351
3D body: height 0.85, standoff 0.75, extent 3.35,6.807 3.647,7.264
3D body: height 0.85, standoff 0.75, extent 4.85,6.807 5.147,7.264
3D body: height 0.85, standoff 0, extent 4.85,7.264 5.147,7.351
3D body: height 0.1, standoff 0, extent 4.85,7.351 5.147,8.085
3D body: height 0.85, standoff 0.75, extent 5.35,6.807 5.647,7.264
3D body: height 0.85, standoff 0, extent 5.35,7.264 5.647,7.351
3D body: height 0.1, standoff 0, extent 5.35,7.351 5.647,8.085
3D body: height 0.1, standoff 0, extent 5.85,7.351 6.147,8.085
3D body: height 0.85, standoff 0, extent 5.85,7.264 6.147,7.351
3D body: height 0.85, standoff 0.75, extent 5.85,6.807 6.147,7.264

## QTO247 + heatsick [mil]
pads (5):
  round 137.8 hole 78.74: 0(-136.34,194) 0(563.66,194)
  rect 110x180 hole 59.06: 1(3,1)
  oval 110x180 hole 59.06: 2(213.66,4) 3(422.32,4)
Top Overlay:
  region: 230,290 290,290 290,150 280,160 230,160 250,180 250,220 230,240
  region: 140,290 190,290 190,240 170,220 170,180 190,160 140,160
  region: -105,290 -105,265 -85,245 -80,245 -70,235 -70,225 -65,220 -65,160 -40,160 -35,165 -50,180 -50,290
  region: -225,290 -175,290 -175,255 -180,255 -200,235 -200,225 -210,215 -210,180 -205,175 -205,160 -225,160
  region: 475,290 525,290 525,255 520,255 500,235 500,225 490,215 490,180 495,175 495,160 475,160
  region: 595,290 595,265 615,245 620,245 630,235 630,225 635,220 635,160 660,160 665,165 650,180 650,290
  lines w10: -225,290 -175,290 -175,260 ; -173.69,257.87 ccw(c-135,195) -105.92,262.86 ; -163.31,220 ccw(c-134.15,190.85) -105,220 ; -105,265 -105,290 -55,290 ; 130,290 185,290 185,235 180,230 ; 181.96,229.73 ccw(c210.85,200.85) 239.73,229.73 ; 240,230 235,235 235,290 280,290 ; 475,290 525,290 525,260 ; 526.31,257.87 ccw(c565,195) 594.08,262.86 ; 595,265 595,290 645,290
  lines w35: -236.34,-156 -236.34,444 ; -42,149 -42,445 ; 129,149 129,445 ; 297,148 297,450 ; 471,148 471,448 ; 663.66,-156 663.66,444
  lines w40: -230,145 655,145
Mechanical 1:
  lines w10: -93.43,76.83 520.75,76.83 ; -93.43,-41.28 520.75,-41.28 520.75,135.89 -93.43,135.89 -93.43,-41.28
3D body "SW3dPS-TO-247.STEP": height 940.6, standoff -479.4, extent -92,-73 508,107
3D body "User Library-heat sink-1.STEP": height 1206.11, standoff 0.6, extent -252.79,-166.67 648.79,479

## QTO247+LageHeatsink [mil]
pads (3):
  rect 100x150 hole 50: 1(0,-1)
  oval 100x150 hole 50: 2(200,1) 3(400,0)
Top Overlay:
  lines w10: -102,-121 -101,-120 -101,102 501,102 500,-122 -101,-122 -100,-121 ; -100,-82 -80.43,-82 cw(c-80.43,-184.43) -8,-112 ; 208,119 526,119 524,-113 1082,-364 ; 214,118 -115,118 -113,-122 -566,-361 -398,-108 -575,-3 -391,106 -568,298 -403,303 -568,592 -111,170 520,172 1078,590 ; 415,-119 ccw(c415,-116.59) 416.71,-118.29 434,-101 cw(c479.87,-146.87) 479.87,-82 499,-82 ; 1084,-367 916,-114 1093,-9 909,100 1086,292 921,297 1086,586
3D body "SW3dPS-to-247ad.STEP": height 1006.77, standoff -610.16, extent -108.98,-107 518.98,91.03
3D body "SW3dPS-aavid 6298b.STEP": height 1100, standoff 100, extent -619,-329 1031,633

## QTO-92 [mil] "TO-92"
height 200
pads (3):
  oval 66x100 hole 32: 1(-100,0) 2(0,0) 3(100,0)
Top Overlay:
  lines w7: -116.52,43.21 cw(c0.97,-12.43) 119.94,39.97 ; -115.34,-40.24 -98,-65 105,-65 118,-39
3D body "SW3dPS-TO92.STEP": height 245.04, standoff -199.79, extent -108.87,-65.56 108.86,95

## QTO-92A [mil] "TO-92"
height 200
pads (3):
  oval 66x100 hole 32: 1(100,0) 2(0,0) 3(-100,0)
Top Overlay:
  lines w7: -116.52,43.21 cw(c0.97,-12.43) 119.08,41.88 ; -115.34,-40.24 -98,-65 105,-65 118,-39
3D body "SW3dPS-TO92.STEP": height 245.04, standoff -199.79, extent -110,-60.56 107.73,100

## QTO-92B [mil] "TO-92"
height 200
pads (3):
  oval 70x100 hole 32: 1(-100,0) 2(0,100) 3(100,0)
Top Overlay:
  lines w7: -116.52,43.21 cw(c0.97,-12.43) -38.82,111.34 ; -115.34,-40.24 -98,-65 105,-65 118,-39 ; 36.81,113.84 cw(c2.42,-11.53) 121.49,40.65

## QTO-92B1 [mil] "TO-92"
height 200
pads (3):
  oval 75x100 hole 32: 1(-115,0) 2(0,0) 3(120,0)
Top Overlay:
  lines w7: -116.52,43.21 cw(c0.97,-12.43) -38.82,111.34 ; -115.34,-40.24 -98,-65 105,-65 118,-39 ; -40.42,111.21 cw(c2.42,-11.53) 121.49,40.65
3D body "SW3dPS-TO92.STEP": height 245.04, standoff -199.79, extent -112.74,-65.56 105,95